# Altium footprint library PCB_Footprints.PcbLib: 303 footprints (part 14 of 19)
Each footprint in its own frame and in the unit in brackets; x right, y up, seen from the top. Pads: shape width x height; smd on the part's side, far side on the other; paste and mask are expansions set on the pad; w line width, h text height; cw(c..) or ccw(c..) is an arc to the next point about the centre after c.
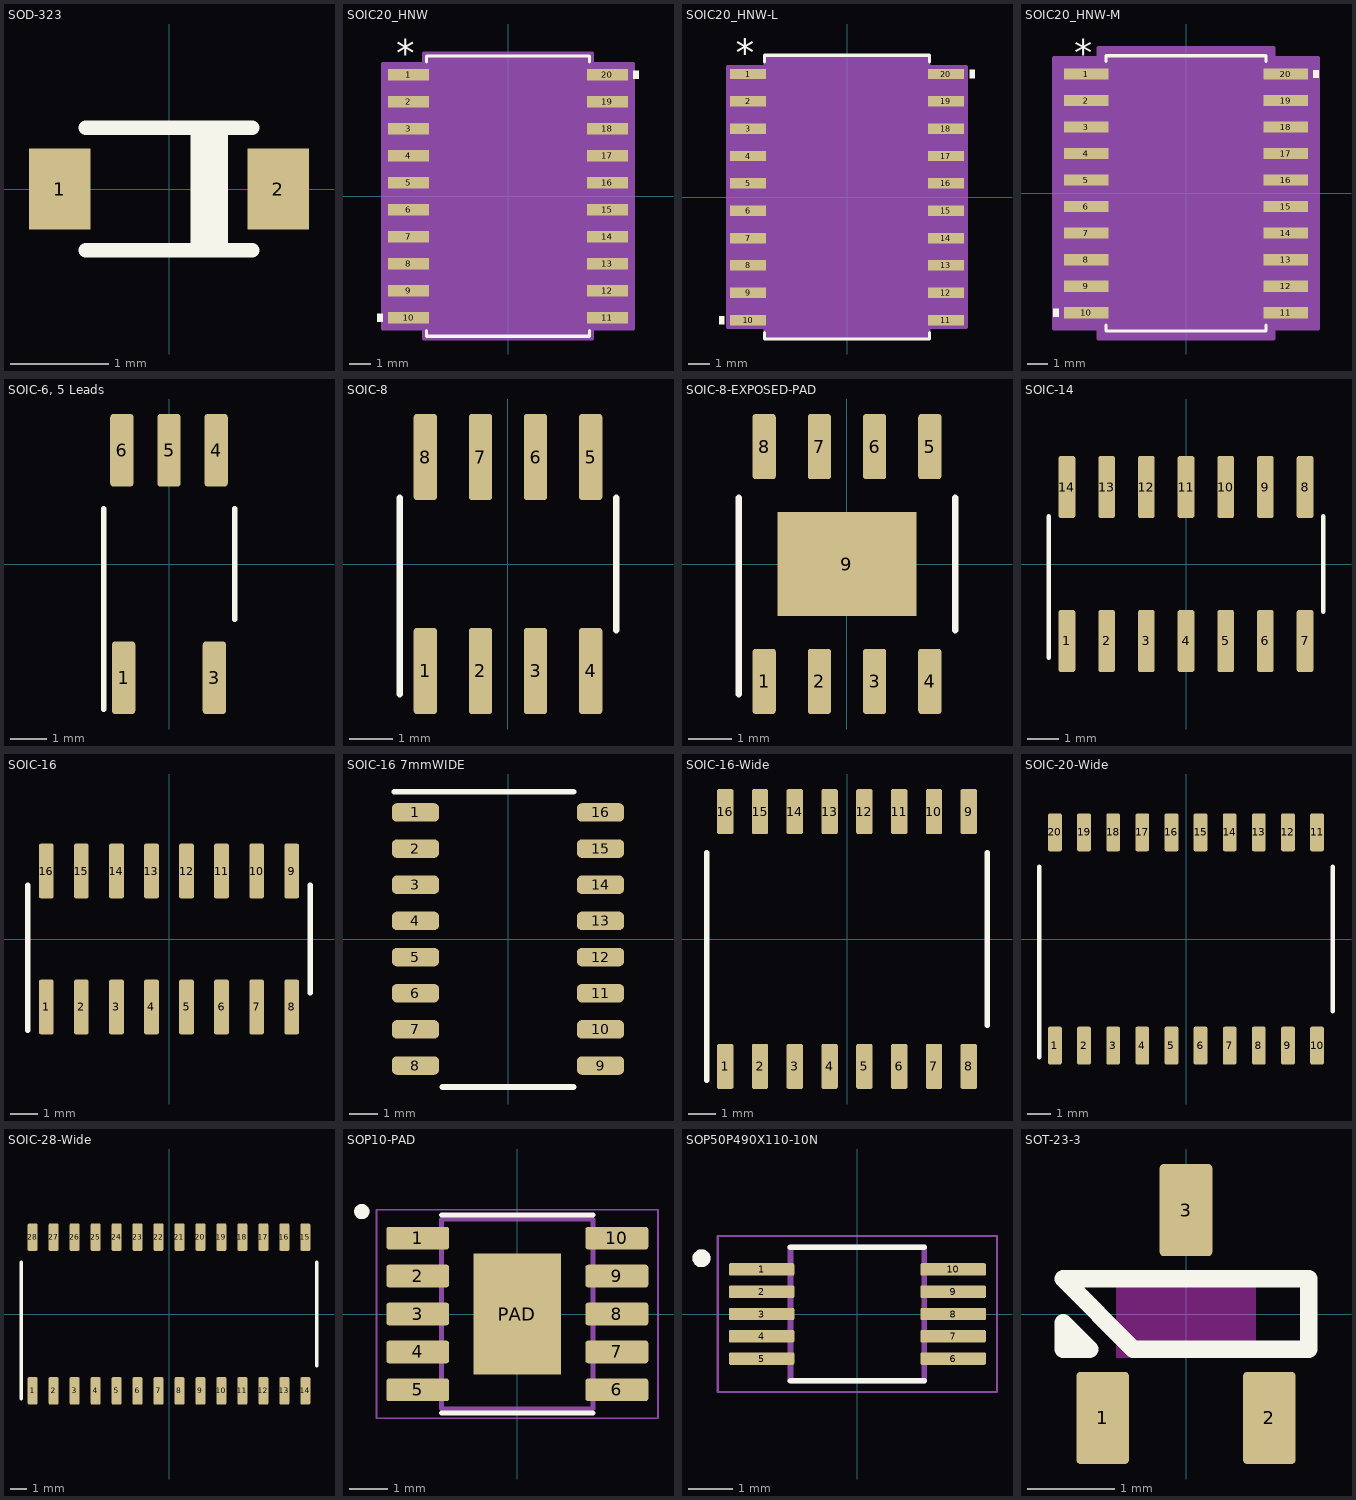
[diagram p13: the footprints below, top view; thin cyan lines are the x and y axes]

## SOD-323 [mm] "SOD-323, SC-76"
pads (2):
  rect 0.63x0.83 smd: 1(-1.115,0) 2(1.115,0)
Top Overlay:
  rectangle: 0.219,-0.625 0.6,0.625
  lines w0.15: -0.85,-0.625 0.85,-0.625 ; -0.85,0.625 0.85,0.625
3D body: height 0.9, standoff 0, extent 0.6,-0.625 0.85,0.625
3D body: height 0.9, standoff 0, extent 0.225,-0.625 0.6,0.625
3D body: height 0.9, standoff 0, extent -0.85,-0.625 0.225,0.625

## SOIC20_HNW [mil]
pads (20):
  rect 76x21 smd paste+0 mask+0: 1(-184,225) 2(-184,175) 3(-184,125) 4(-184,75) 5(-184,25) 6(-184,-25) 7(-184,-75) 8(-184,-125) 9(-184,-175) 10(-184,-225) 11(184,-225) 12(184,-175) 13(184,-125) 14(184,-75) 15(184,-25) 16(184,25) 17(184,75) 18(184,125) 19(184,175) 20(184,225)
Top Overlay:
  region: 232,232.5 242,232.5 242,217.5 232,217.5
  region: -232,-217.5 -242,-217.5 -242,-232.5 -232,-232.5
  lines w6: -151,-248.6 -151,-259.5 151,-259.5 151,-248.6 ; -151,248.6 -151,259.5 151,259.5 151,248.6
  text "*" at -206.5,241 h50
Mechanical 13:
  lines w0: -12,254.5 ccw(c0,254.5) 12,254.5
  lines w1: -208,-234.5 -146,-234.5 -146,-215.5 -208,-215.5 -208,-234.5 ; -208,-184.5 -146,-184.5 -146,-165.5 -208,-165.5 -208,-184.5 ; -208,-134.5 -146,-134.5 -146,-115.5 -208,-115.5 -208,-134.5 ; -208,-84.5 -146,-84.5 -146,-65.5 -208,-65.5 -208,-84.5 ; -208,-34.5 -146,-34.5 -146,-15.5 -208,-15.5 -208,-34.5 ; -208,15.5 -146,15.5 -146,34.5 -208,34.5 -208,15.5 ; -208,65.5 -146,65.5 -146,84.5 -208,84.5 -208,65.5 ; -208,115.5 -146,115.5 -146,134.5 -208,134.5 -208,115.5 ; -208,165.5 -146,165.5 -146,184.5 -208,184.5 -208,165.5 ; -208,215.5 -146,215.5 -146,234.5 -208,234.5 -208,215.5 ; -146,-254.5 -146,254.5 146,254.5 146,-254.5 -146,-254.5 ; 146,-234.5 208,-234.5 208,-215.5 146,-215.5 146,-234.5 ; 146,-184.5 208,-184.5 208,-165.5 146,-165.5 146,-184.5 ; 146,-134.5 208,-134.5 208,-115.5 146,-115.5 146,-134.5 ; 146,-84.5 208,-84.5 208,-65.5 146,-65.5 146,-84.5 ; 146,-34.5 208,-34.5 208,-15.5 146,-15.5 146,-34.5 ; 146,15.5 208,15.5 208,34.5 146,34.5 146,15.5 ; 146,65.5 208,65.5 208,84.5 146,84.5 146,65.5 ; 146,115.5 208,115.5 208,134.5 146,134.5 146,115.5 ; 146,165.5 208,165.5 208,184.5 146,184.5 146,165.5 ; 146,215.5 208,215.5 208,234.5 146,234.5 146,215.5
  text "*" at -143.5,201.5 h50
Mechanical 15:
  region: -156,-245.5 -232,-245.5 -232,245.5 -156,245.5 -156,264.5 156,264.5 156,245.5 232,245.5 232,-245.5 156,-245.5 156,-264.5 -156,-264.5
  lines w6: -232,-245.5 -156,-245.5 -156,-264.5 156,-264.5 156,-245.5 232,-245.5 232,245.5 156,245.5 156,264.5 -156,264.5 -156,245.5 -232,245.5 -232,-245.5
3D body "SOIC20_HNW.step": height 104.09, standoff 0, extent -207.99,-254.49 207.99,254.49

## SOIC20_HNW-L [mil]
pads (20):
  rect 66x19 smd paste+0 mask+0: 1(-181,225) 2(-181,175) 3(-181,125) 4(-181,75) 5(-181,25) 6(-181,-25) 7(-181,-75) 8(-181,-125) 9(-181,-175) 10(-181,-225) 11(181,-225) 12(181,-175) 13(181,-125) 14(181,-75) 15(181,-25) 16(181,25) 17(181,75) 18(181,125) 19(181,175) 20(181,225)
Top Overlay:
  region: -224,-217.5 -234,-217.5 -234,-232.5 -224,-232.5
  region: 224,232.5 234,232.5 234,217.5 224,217.5
  lines w6: -151,-247.6 -151,-259.5 151,-259.5 151,-247.6 ; -151,247.6 -151,259.5 151,259.5 151,247.6
  text "*" at -203.5,239 h50
Mechanical 13:
  lines w0: -12,254.5 ccw(c0,254.5) 12,254.5
  lines w1: -208,-234.5 -208,-215.5 -146,-215.5 -146,-234.5 -208,-234.5 ; -208,-184.5 -208,-165.5 -146,-165.5 -146,-184.5 -208,-184.5 ; -208,-134.5 -208,-115.5 -146,-115.5 -146,-134.5 -208,-134.5 ; -208,-84.5 -208,-65.5 -146,-65.5 -146,-84.5 -208,-84.5 ; -208,-34.5 -208,-15.5 -146,-15.5 -146,-34.5 -208,-34.5 ; -208,15.5 -208,34.5 -146,34.5 -146,15.5 -208,15.5 ; -208,65.5 -208,84.5 -146,84.5 -146,65.5 -208,65.5 ; -208,115.5 -208,134.5 -146,134.5 -146,115.5 -208,115.5 ; -208,165.5 -208,184.5 -146,184.5 -146,165.5 -208,165.5 ; -208,215.5 -208,234.5 -146,234.5 -146,215.5 -208,215.5 ; -146,-254.5 146,-254.5 146,254.5 -146,254.5 -146,-254.5 ; 146,-234.5 146,-215.5 208,-215.5 208,-234.5 146,-234.5 ; 146,-184.5 146,-165.5 208,-165.5 208,-184.5 146,-184.5 ; 146,-134.5 146,-115.5 208,-115.5 208,-134.5 146,-134.5 ; 146,-84.5 146,-65.5 208,-65.5 208,-84.5 146,-84.5 ; 146,-34.5 146,-15.5 208,-15.5 208,-34.5 146,-34.5 ; 146,15.5 146,34.5 208,34.5 208,15.5 146,15.5 ; 146,65.5 146,84.5 208,84.5 208,65.5 146,65.5 ; 146,115.5 146,134.5 208,134.5 208,115.5 146,115.5 ; 146,165.5 146,184.5 208,184.5 208,165.5 146,165.5 ; 146,215.5 146,234.5 208,234.5 208,215.5 146,215.5
  text "*" at -143.5,201.5 h50
Mechanical 15:
  region: -150,-238.5 -218,-238.5 -218,238.5 -150,238.5 -150,258.5 150,258.5 150,238.5 218,238.5 218,-238.5 150,-238.5 150,-258.5 -150,-258.5
  lines w6: -218,-238.5 -218,238.5 -150,238.5 -150,258.5 150,258.5 150,238.5 218,238.5 218,-238.5 150,-238.5 150,-258.5 -150,-258.5 -150,-238.5 -218,-238.5
3D body "SOIC20_HNW.step": height 104.09, standoff 0, extent -207.99,-254.49 207.99,254.49

## SOIC20_HNW-M [mil]
pads (20):
  rect 84x21 smd paste+0 mask+0: 1(-188,225) 2(-188,175) 3(-188,125) 4(-188,75) 5(-188,25) 6(-188,-25) 7(-188,-75) 8(-188,-125) 9(-188,-175) 10(-188,-225) 11(188,-225) 12(188,-175) 13(188,-125) 14(188,-75) 15(188,-25) 16(188,25) 17(188,75) 18(188,125) 19(188,175) 20(188,225)
Top Overlay:
  region: 240,232.5 250,232.5 250,217.5 240,217.5
  region: -240,-217.5 -250,-217.5 -250,-232.5 -240,-232.5
  lines w6: -151,-248.6 -151,-259.5 151,-259.5 151,-248.6 ; -151,248.6 -151,259.5 151,259.5 151,248.6
  text "*" at -210.5,241 h50
Mechanical 13:
  lines w0: -12,254.5 ccw(c0,254.5) 12,254.5
  lines w1: -208,-234.5 -146,-234.5 -146,-215.5 -208,-215.5 -208,-234.5 ; -208,-184.5 -146,-184.5 -146,-165.5 -208,-165.5 -208,-184.5 ; -208,-134.5 -146,-134.5 -146,-115.5 -208,-115.5 -208,-134.5 ; -208,-84.5 -146,-84.5 -146,-65.5 -208,-65.5 -208,-84.5 ; -208,-34.5 -146,-34.5 -146,-15.5 -208,-15.5 -208,-34.5 ; -208,15.5 -146,15.5 -146,34.5 -208,34.5 -208,15.5 ; -208,65.5 -146,65.5 -146,84.5 -208,84.5 -208,65.5 ; -208,115.5 -146,115.5 -146,134.5 -208,134.5 -208,115.5 ; -208,165.5 -146,165.5 -146,184.5 -208,184.5 -208,165.5 ; -208,215.5 -146,215.5 -146,234.5 -208,234.5 -208,215.5 ; -146,-254.5 -146,254.5 146,254.5 146,-254.5 -146,-254.5 ; 146,-234.5 208,-234.5 208,-215.5 146,-215.5 146,-234.5 ; 146,-184.5 208,-184.5 208,-165.5 146,-165.5 146,-184.5 ; 146,-134.5 208,-134.5 208,-115.5 146,-115.5 146,-134.5 ; 146,-84.5 208,-84.5 208,-65.5 146,-65.5 146,-84.5 ; 146,-34.5 208,-34.5 208,-15.5 146,-15.5 146,-34.5 ; 146,15.5 208,15.5 208,34.5 146,34.5 146,15.5 ; 146,65.5 208,65.5 208,84.5 146,84.5 146,65.5 ; 146,115.5 208,115.5 208,134.5 146,134.5 146,115.5 ; 146,165.5 208,165.5 208,184.5 146,184.5 146,165.5 ; 146,215.5 208,215.5 208,234.5 146,234.5 146,215.5
  text "*" at -143.5,201.5 h50
Mechanical 15:
  region: -166,-255.5 -250,-255.5 -250,255.5 -166,255.5 -166,274.5 166,274.5 166,255.5 250,255.5 250,-255.5 166,-255.5 166,-274.5 -166,-274.5
  lines w6: -250,-255.5 -166,-255.5 -166,-274.5 166,-274.5 166,-255.5 250,-255.5 250,255.5 166,255.5 166,274.5 -166,274.5 -166,255.5 -250,255.5 -250,-255.5
3D body "SOIC20_HNW.step": height 104.09, standoff 0, extent -207.99,-254.49 207.99,254.49

## SOIC-6, 5 Leads [mm] "6-SOIC (0.173\", 4.40mm Width), 5 Leads, JEDEC MO-155 Package"
height 2.5
pads (5):
  rrect25% 0.64x2 smd: 1(-1.25,-3.135) 3(1.25,-3.135) 4(1.3,3.135) 5(0,3.135) 6(-1.3,3.135)
Top Overlay:
  lines w0.15: -1.8,-4 -1.8,1.524 ; 1.81,-1.524 1.81,1.524
3D body: height 2.5, standoff 0, extent -1.8,-2.2 1.8,2.2

## SOIC-8 [mil] "8-Lead Plastic Small Outline, 0.15in pitch,  LTC DWG # 05-08-1610 Rev G"
height 68.98
pads (8):
  rrect25% 21x78 smd: 1(-75,-97) 2(-25,-97) 3(25,-97) 4(75,-97) 5(75,97) 6(25,97) 7(-25,97) 8(-75,97)
Top Overlay:
  lines w5.91: -98,-118.11 -98,60 ; 98,-60 98,60
3D body "User Library-SOIC8_JEDEC_MS-012AA.step": height 68.7, standoff -0.31, extent -98.41,-122.02 98.44,122.04

## SOIC-8-EXPOSED-PAD [mm] "8-Lead Plastic Small Outline, 0.15in pitch,  LTC DWG # 05-08-1610 Rev G"
height 1.752
pads (9):
  rrect25% 0.533x1.5 smd: 1(-1.905,-2.7) 2(-0.635,-2.7) 3(0.635,-2.7) 4(1.905,-2.7) 5(1.905,2.7) 6(0.635,2.7) 7(-0.635,2.7) 8(-1.905,2.7)
  rect 3.2x2.4 smd: 9(0,0)
Top Overlay:
  lines w0.15: -2.489,-3 -2.489,1.524 ; 2.489,-1.524 2.489,1.524
3D body "User Library-SOIC8_JEDEC_MS-012AA.step": height 1.75, standoff -0.01, extent -2.5,-3.099 2.5,3.1

## SOIC-14 [mil] "14-Lead Plastic Small Outline, 0.05in pitch,  According to Maxim 90-0112 rev.B"
height 68.98
pads (14):
  rrect25% 21x78 smd: 1(-150,-97) 2(-100,-97) 3(-50,-97) 4(0,-97) 5(50,-97) 6(100,-97) 7(150,-97) 8(150,97) 9(100,97) 10(50,97) 11(0,97) 12(-50,97) 13(-100,97) 14(-150,97)
Top Overlay:
  lines w5.91: -173,-118.11 -173,60 ; 173,-60 173,60
3D body "User Library-SOIC14_JEDEC_MS-012AB.step": height 68.7, standoff -0.2, extent -172.23,-122.02 172.25,122.04

## SOIC-16 [mil] "3.9mm, 16-Lead Plastic Small Outline. According to Maxim 90-0097 rev.A"
height 104.33
pads (16):
  rrect25% 21x78 smd: 1(-175,-97) 2(-125,-97) 3(-75,-97) 4(-25,-97) 5(25,-97) 6(75,-97) 7(125,-97) 8(175,-97) 9(175,97) 10(125,97) 11(75,97) 12(25,97) 13(-25,97) 14(-75,97) 15(-125,97) 16(-175,97)
Top Overlay:
  lines w7.87: -201.77,-129.92 -201.77,76.77 ; 201.77,-76.77 201.77,76.77
3D body "User Library-SOIC127P600X175-16.step": height 64.96, standoff 0, extent -196.84,-119.68 196.86,119.69

## SOIC-16 7mmWIDE [mm] "Footprint from TLP293-4 chip found via componentsearchengin"
height 2.1
pads (16):
  rrect50% 1.65x0.65 smd: 1(-3.25,4.445) 2(-3.25,3.175) 3(-3.25,1.905) 4(-3.25,0.635) 5(-3.25,-0.635) 6(-3.25,-1.905) 7(-3.25,-3.175) 8(-3.25,-4.445) 9(3.25,-4.445) 10(3.25,-3.175) 11(3.25,-1.905) 12(3.25,-0.635) 13(3.25,0.635) 14(3.25,1.905) 15(3.25,3.175) 16(3.25,4.445)
Top Overlay:
  lines w0.2: -4,5.175 2.3,5.175 ; -2.3,-5.2 2.3,-5.2
3D body "TLP293-4(V4GBTPE.stp": height 2.2, standoff 0, extent -3.5,-5.175 3.5,5.175

## SOIC-16-Wide [mm] "16-Lead Plastic Small Outline, 0.30in pitch,  TI DW0016B 4221003/A 08/2013"
height 2.65
pads (16):
  rrect25% 0.6x1.65 smd: 1(-4.445,-4.65) 2(-3.175,-4.65) 3(-1.905,-4.65) 4(-0.635,-4.65) 5(0.635,-4.65) 6(1.905,-4.65) 7(3.175,-4.65) 8(4.445,-4.65) 9(4.445,4.65) 10(3.175,4.65) 11(1.905,4.65) 12(0.635,4.65) 13(-0.635,4.65) 14(-1.905,4.65) 15(-3.175,4.65) 16(-4.445,4.65)
Top Overlay:
  lines w0.2: -5.125,-5.15 -5.125,3.15 ; 5.125,-3.15 5.125,3.15
3D body "SW3dPS-SOIC16-300.STEP": height 2.65, standoff 0, extent -5.15,-5.15 5.15,5.15

## SOIC-20-Wide [mm] "20-Lead Plastic Small Outline, 0.30in pitch,  Expanded from TI DW0016B 4221003/A 08/2013"
height 2.65
pads (20):
  rrect25% 0.6x1.65 smd: 1(-5.715,-4.65) 2(-4.445,-4.65) 3(-3.175,-4.65) 4(-1.905,-4.65) 5(-0.635,-4.65) 6(0.635,-4.65) 7(1.905,-4.65) 8(3.175,-4.65) 9(4.445,-4.65) 10(5.715,-4.65) 11(5.715,4.65) 12(4.445,4.65) 13(3.175,4.65) 14(1.905,4.65) 15(0.635,4.65) 16(-0.635,4.65) 17(-1.905,4.65) 18(-3.175,4.65) 19(-4.445,4.65) 20(-5.715,4.65)
Top Overlay:
  lines w0.2: -6.395,-5.15 -6.395,3.15 ; 6.395,-3.15 6.395,3.15
3D body "User Library-SOIC20-300.step": height 2.65, standoff 0, extent -6.4,-5.15 6.4,5.15

## SOIC-28-Wide [mm] "28-Lead Plastic Small Outline, 0.30in pitch,  Expanded from TI DW0016B 4221003/A 08/2013"
height 2.65
pads (28):
  rrect25% 0.6x1.65 smd: 1(-8.255,-4.65) 2(-6.985,-4.65) 3(-5.715,-4.65) 4(-4.445,-4.65) 5(-3.175,-4.65) 6(-1.905,-4.65) 7(-0.635,-4.65) 8(0.635,-4.65) 9(1.905,-4.65) 10(3.175,-4.65) 11(4.445,-4.65) 12(5.715,-4.65) 13(6.985,-4.65) 14(8.255,-4.65) 15(8.255,4.65) 16(6.985,4.65) 17(5.715,4.65) 18(4.445,4.65) 19(3.175,4.65) 20(1.905,4.65) 21(0.635,4.65) 22(-0.635,4.65) 23(-1.905,4.65) 24(-3.175,4.65) 25(-4.445,4.65) 26(-5.715,4.65) 27(-6.985,4.65) 28(-8.255,4.65)
Top Overlay:
  lines w0.2: -8.935,-5.15 -8.935,3.15 ; 8.935,-3.15 8.935,3.15
3D body "User Library-SOIC28-300.step": height 2.65, standoff 0, extent -8.95,-5.15 8.95,5.15

## SOP10-PAD [mm]
pads (11):
  rrect25% 1.66x0.6 smd: 1(-2.625,2) 2(-2.625,1) 3(-2.625,0) 4(-2.625,-1) 5(-2.625,-2) 6(2.625,-2) 7(2.625,-1) 8(2.625,0) 9(2.625,1) 10(2.625,2)
  rect 2.3x3.2 smd: PAD(0,0)
Top Overlay:
  circle w0.2: c-4.1,2.7 r0.1
  lines w0.127: -2,-2.614 2,-2.614 ; -2,2.614 2,2.614
Mechanical 13:
  circle w0.2: c-4.1,2.7 r0.1
  lines w0.127: -2,-2.5 2,-2.5 2,2.5 -2,2.5 -2,-2.5
Mechanical 15:
  lines w0.05: -3.71,-2.75 3.71,-2.75 3.71,2.75 -3.71,2.75 -3.71,-2.75

## SOP50P490X110-10N [mm]
pads (10):
  rrect25% 1.47x0.28 smd: 1(-2.15,1) 2(-2.15,0.5) 3(-2.15,0) 4(-2.15,-0.5) 5(-2.15,-1) 6(2.15,-1) 7(2.15,-0.5) 8(2.15,0) 9(2.15,0.5) 10(2.15,1)
Top Overlay:
  circle w0.2: c-3.5,1.25 r0.1
  lines w0.127: -1.5,-1.5 1.5,-1.5 ; -1.5,1.5 1.5,1.5
Mechanical 13:
  circle w0.2: c-3.5,1.25 r0.1
  lines w0.127: -1.5,-1.5 -1.5,1.5 1.5,1.5 1.5,-1.5 -1.5,-1.5
Mechanical 15:
  lines w0.05: -3.135,-1.75 -3.135,1.75 3.135,1.75 3.135,-1.75 -3.135,-1.75
3D body "ADS1113IDGST.STEP": height 1.1, standoff 0, extent -2.45,-1.5 2.45,1.5

## SOT-23-3 [mm] "SOT23-3, from TI DBZ (R-PDSO-G3)"
height 1.2
pads (3):
  rrect15% 0.6x1.05 smd: 1(-0.95,-1.185) 2(0.95,-1.185) 3(0,1.185)
Top Layer keep-out:
  rectangle: -0.8,-0.5 0.8,0.5
Top Overlay:
  lines w0.2: -1.4,-0.4 -1.4,-0.1 -1.1,-0.4 -1.4,-0.4 ; -1.4,0.4 -0.6,-0.4 1.4,-0.4 1.4,0.4 -1.4,0.4
3D body "User Library-SOT-23.step": height 0.98, standoff -0.01, extent -1.448,-1.21 1.448,1.21